# Altium footprint library BASIC.PcbLib: 244 footprints (part 7 of 16)
Each footprint in its own frame and in the unit in brackets; x right, y up, seen from the top. Pads: shape width x height; smd on the part's side, far side on the other; paste and mask are expansions set on the pad; w line width, h text height; cw(c..) or ccw(c..) is an arc to the next point about the centre after c.
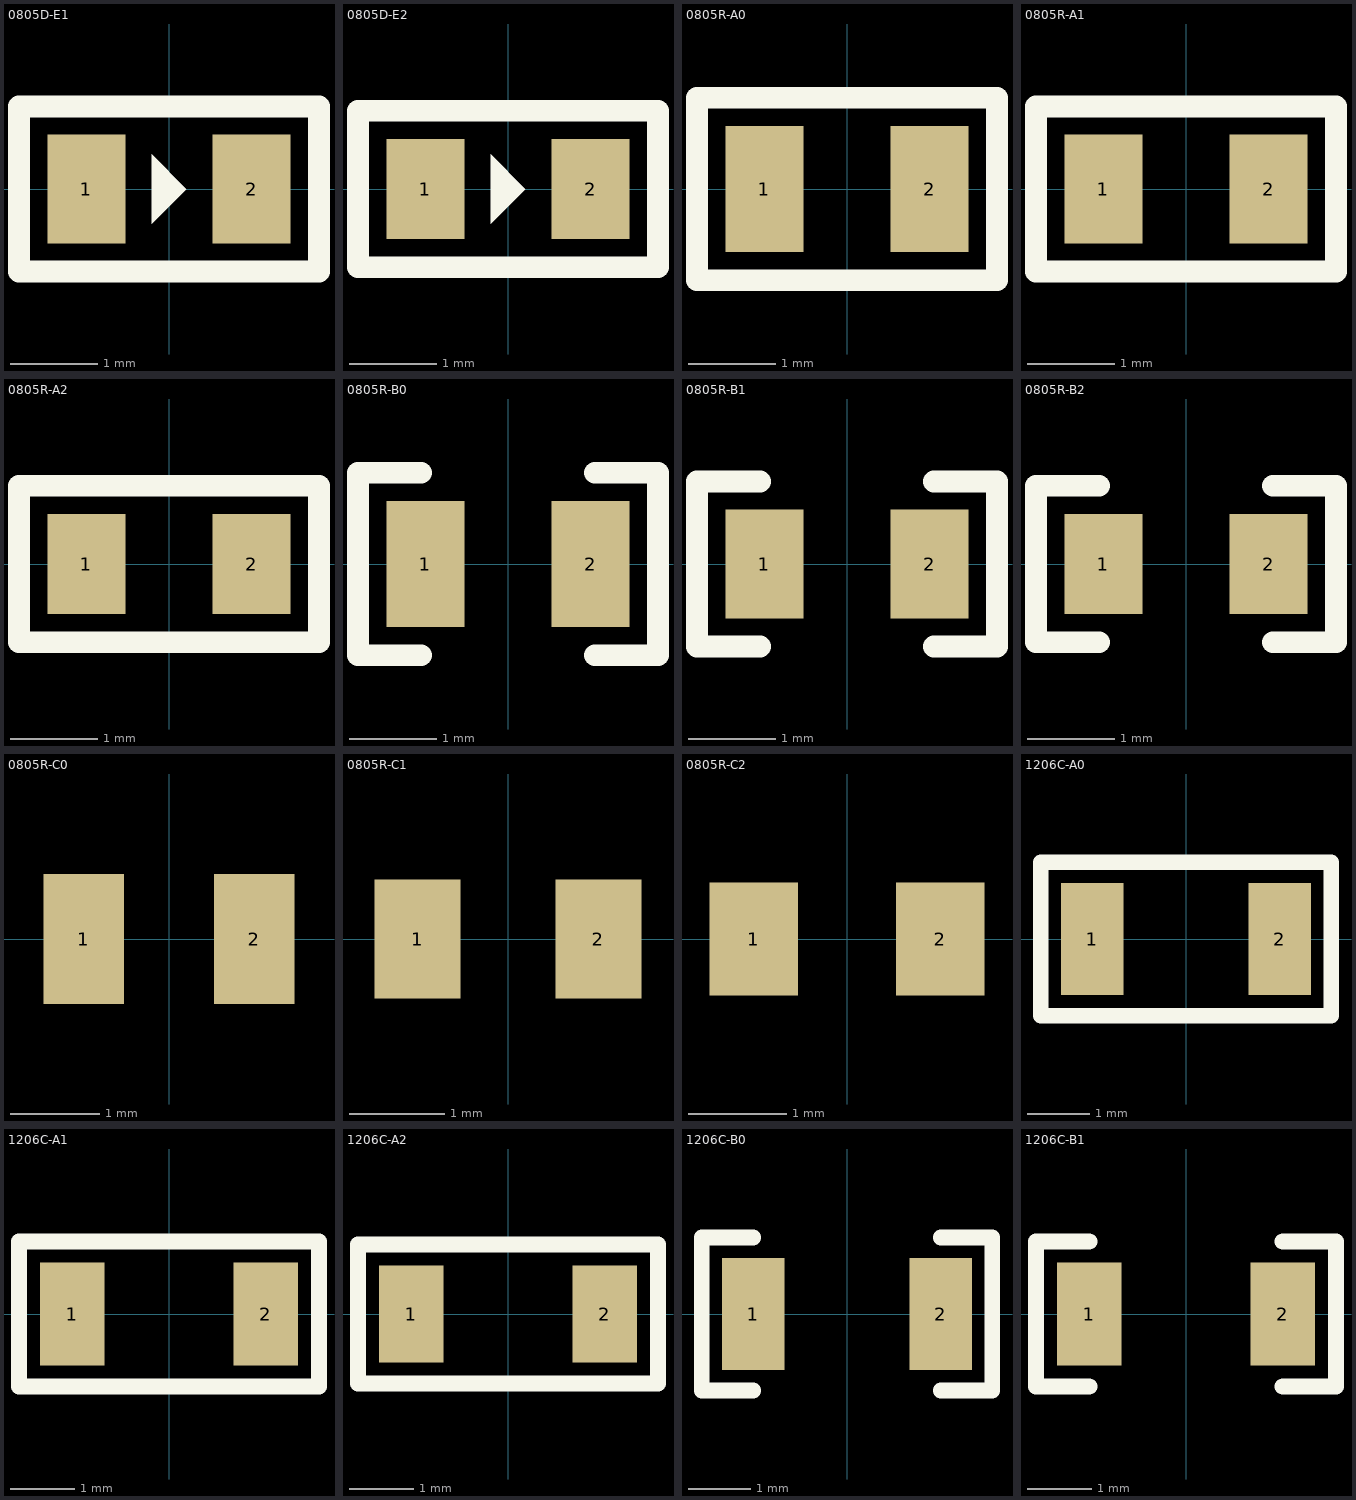
[diagram p6: the footprints below, top view; thin cyan lines are the x and y axes]

## 0805D-E1 [mm]
pads (2):
  rect 0.9x1.25 smd: 1(-0.95,0) 2(0.95,0)
Top Overlay:
  region: -0.2,0.4 -0.2,-0.4 0.2,0
  lines w0.25: -1.725,-0.95 -1.725,0.95 1.725,0.95 1.725,-0.95 -1.725,-0.95
3D body "RES0805.step": height 0.55, standoff 0, extent -1,-0.624 1,0.626

## 0805D-E2 [mm]
pads (2):
  rect 0.9x1.15 smd: 1(-0.95,0) 2(0.95,0)
Top Overlay:
  region: -0.2,0.4 -0.2,-0.4 0.2,0
  lines w0.25: -1.725,-0.9 -1.725,0.9 1.725,0.9 1.725,-0.9 -1.725,-0.9
3D body "RES0805.step": height 0.55, standoff 0, extent -1,-0.624 1,0.626

## 0805R-A0 [mm]
pads (2):
  rect 0.9x1.45 smd: 1(-0.95,0) 2(0.95,0)
Top Overlay:
  lines w0.25: -1.725,-1.05 1.725,-1.05 1.725,1.05 -1.725,1.05 -1.725,-1.05
3D body "RES0805.step": height 0.55, standoff 0, extent -1,-0.624 1,0.626

## 0805R-A1 [mm]
pads (2):
  rect 0.9x1.25 smd: 1(-0.95,0) 2(0.95,0)
Top Overlay:
  lines w0.25: -1.725,-0.95 1.725,-0.95 1.725,0.95 -1.725,0.95 -1.725,-0.95
3D body "RES0805.step": height 0.55, standoff 0, extent -1,-0.624 1,0.626

## 0805R-A2 [mm]
pads (2):
  rect 0.9x1.15 smd: 1(-0.95,0) 2(0.95,0)
Top Overlay:
  lines w0.25: -1.725,-0.9 1.725,-0.9 1.725,0.9 -1.725,0.9 -1.725,-0.9
3D body "RES0805.step": height 0.55, standoff 0, extent -1,-0.624 1,0.626

## 0805R-B0 [mm]
pads (2):
  rect 0.9x1.45 smd: 1(-0.95,0) 2(0.95,0)
Top Overlay:
  lines w0.25: -1,-1.05 -1.725,-1.05 -1.725,1.05 -1,1.05 ; 1,-1.05 1.725,-1.05 1.725,1.05 1,1.05
3D body "RES0805.step": height 0.55, standoff 0, extent -1,-0.624 1,0.626

## 0805R-B1 [mm]
pads (2):
  rect 0.9x1.25 smd: 1(-0.95,0) 2(0.95,0)
Top Overlay:
  lines w0.25: -1,-0.95 -1.725,-0.95 -1.725,0.95 -1,0.95 ; 1,-0.95 1.725,-0.95 1.725,0.95 1,0.95
3D body "RES0805.step": height 0.55, standoff 0, extent -1,-0.624 1,0.626

## 0805R-B2 [mm]
pads (2):
  rect 0.9x1.15 smd: 1(-0.95,0) 2(0.95,0)
Top Overlay:
  lines w0.25: -1,-0.9 -1.725,-0.9 -1.725,0.9 -1,0.9 ; 1,-0.9 1.725,-0.9 1.725,0.9 1,0.9
3D body "RES0805.step": height 0.55, standoff 0, extent -1,-0.624 1,0.626

## 0805R-C0 [mm]
pads (2):
  rect 0.9x1.45 smd: 1(-0.95,0) 2(0.95,0)
3D body "RES0805.step": height 0.55, standoff 0, extent -1,-0.624 1,0.626

## 0805R-C1 [mm]
pads (2):
  rect 0.9x1.25 smd: 1(-0.95,0) 2(0.95,0)
3D body "RES0805.step": height 0.55, standoff 0, extent -1,-0.624 1,0.626

## 0805R-C2 [mm]
pads (2):
  rect 0.9x1.15 smd: 1(-0.95,0) 2(0.95,0)
3D body "RES0805.step": height 0.55, standoff 0, extent -1,-0.624 1,0.626

## 1206C-A0 [mm]
pads (2):
  rect 1x1.8 smd: 1(-1.5,0) 2(1.5,0)
Top Overlay:
  lines w0.25: -2.325,-1.225 2.325,-1.225 2.325,1.225 -2.325,1.225 -2.325,-1.225
3D body "1206R.stp": height 0.6, standoff 0, extent -1.6,-0.8 1.6,0.8

## 1206C-A1 [mm]
pads (2):
  rect 1x1.6 smd: 1(-1.5,0) 2(1.5,0)
Top Overlay:
  lines w0.25: -2.325,-1.125 2.325,-1.125 2.325,1.125 -2.325,1.125 -2.325,-1.125
3D body "1206R.stp": height 0.6, standoff 0, extent -1.6,-0.8 1.6,0.8

## 1206C-A2 [mm]
pads (2):
  rect 1x1.5 smd: 1(-1.5,0) 2(1.5,0)
Top Overlay:
  lines w0.25: -2.325,-1.075 -2.325,1.075 2.325,1.075 2.325,-1.075 -2.325,-1.075
3D body "1206R.stp": height 0.6, standoff 0, extent -1.6,-0.8 1.6,0.8

## 1206C-B0 [mm]
pads (2):
  rect 1x1.8 smd: 1(-1.5,0) 2(1.5,0)
Top Overlay:
  lines w0.25: -1.5,-1.225 -2.325,-1.225 -2.325,1.225 -1.5,1.225 ; 1.5,-1.225 2.325,-1.225 2.325,1.225 1.5,1.225
3D body "1206R.stp": height 0.6, standoff 0, extent -1.6,-0.8 1.6,0.8

## 1206C-B1 [mm]
pads (2):
  rect 1x1.6 smd: 1(-1.5,0) 2(1.5,0)
Top Overlay:
  lines w0.25: -1.5,-1.125 -2.325,-1.125 -2.325,1.125 -1.5,1.125 ; 1.5,-1.125 2.325,-1.125 2.325,1.125 1.5,1.125
3D body "1206R.stp": height 0.6, standoff 0, extent -1.6,-0.8 1.6,0.8